# Altium footprint library Connectors.PcbLib: 68 footprints (part 4 of 5)
Each footprint in its own frame and in the unit in brackets; x right, y up, seen from the top. Pads: shape width x height; smd on the part's side, far side on the other; paste and mask are expansions set on the pad; w line width, h text height; cw(c..) or ccw(c..) is an arc to the next point about the centre after c.
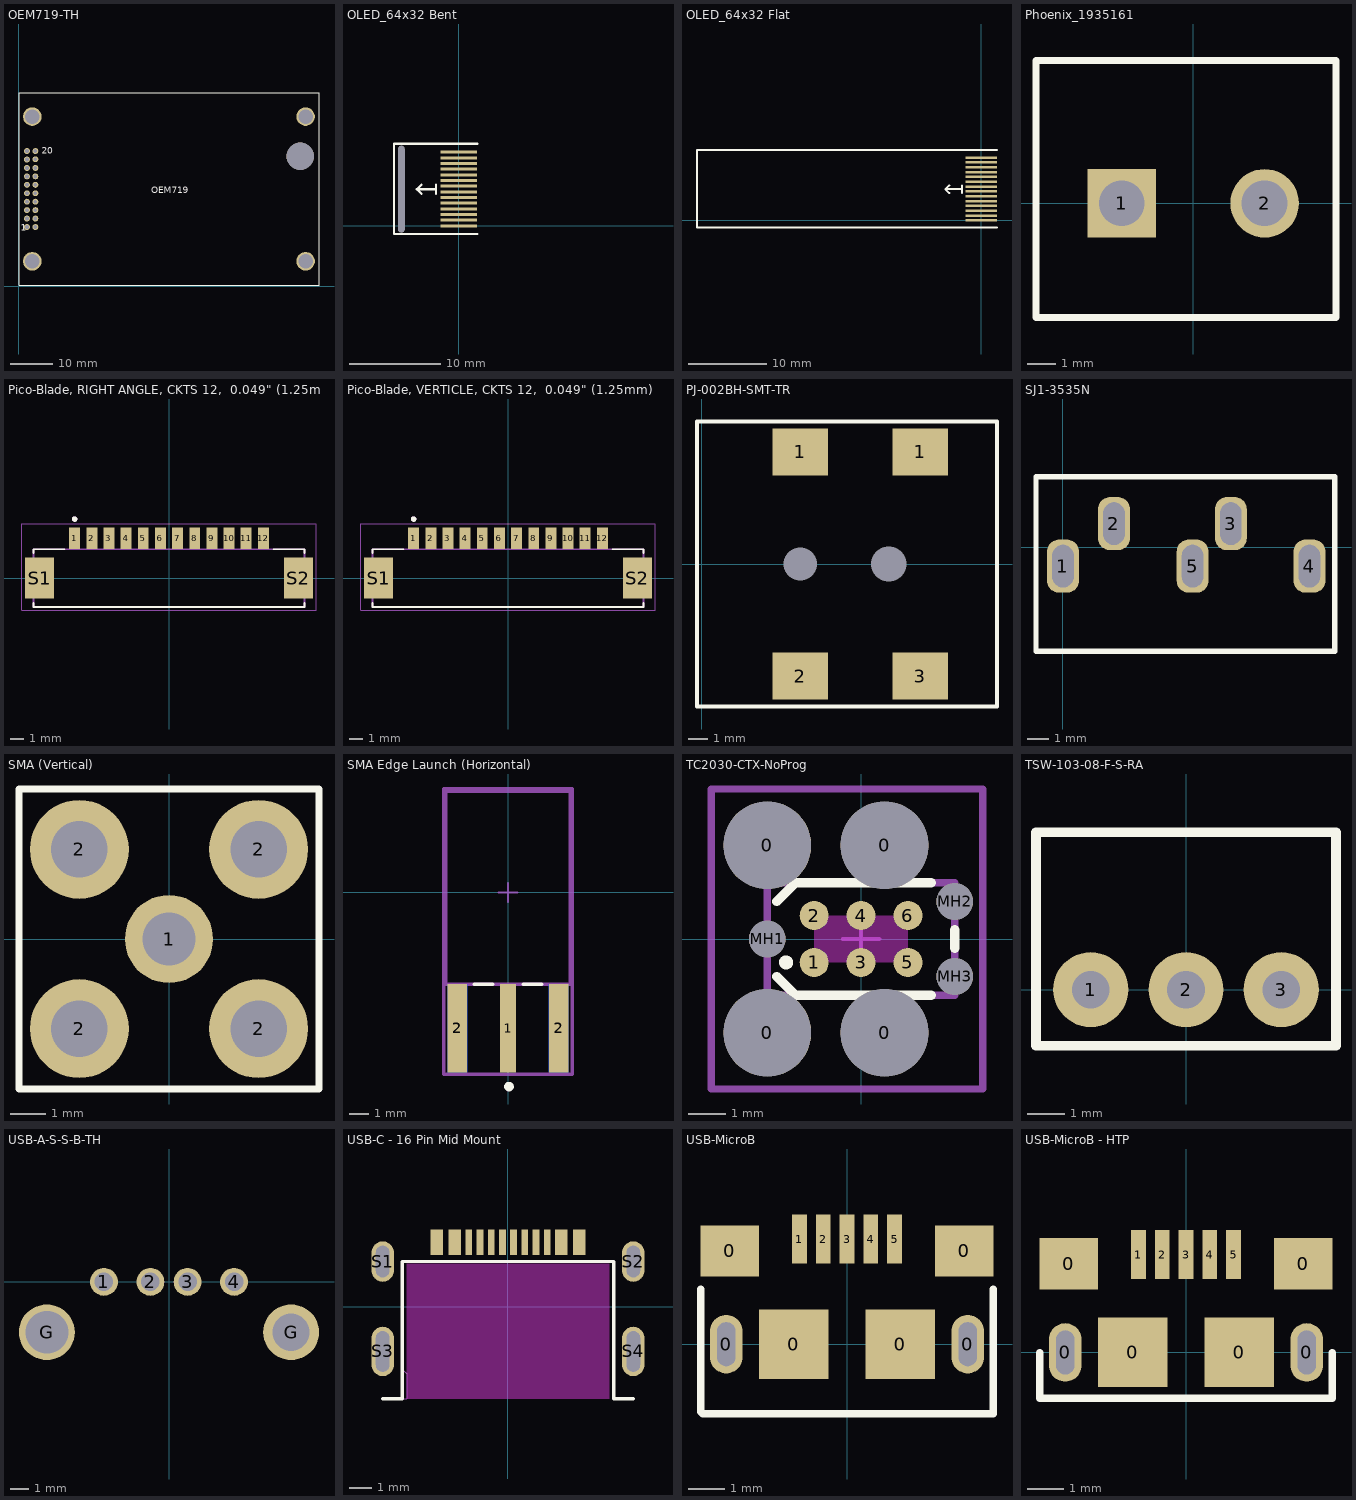
[diagram p3: the footprints below, top view; thin cyan lines are the x and y axes]

## OEM719-TH [mm] "OEM719 GPS through hole footprint"
height 6.5
pads (25):
  round 1.4 hole 0.89: 1(1.98,13.99) 2(3.98,13.99) 3(1.98,15.99) 4(3.98,15.99) 5(1.98,17.99) 6(3.98,17.99) 7(1.98,19.99) 8(3.98,19.99) 9(1.98,21.99) 10(3.98,21.99) 11(1.98,23.99) 12(3.98,23.99) 13(1.98,25.99) 14(3.98,25.99) 15(1.98,27.99) 16(3.98,27.99) 17(1.98,29.99) 18(3.98,30.04) 19(1.98,31.99) 20(3.98,31.99)
  round 4.4 hole 3.45: ""(3.25,5.87) ""(3.25,40.16) ""(68.02,5.87) ""(68.02,40.16)
  round 6.5 hole 6.5: ""(66.75,30.76)
Top Overlay:
  lines w0.254: 0.1,0.15 71.2,0.15 71.2,45.85 0.1,45.85 0.1,0.15
  text "20" at 5.45,31.4 h1.52
  text "1" at 0.55,13.15 h1.52
  text "OEM719" at 31.45,21.95 h1.52

## OLED_64x32 Bent [mm] "0.69\" OLED Bent"
pads (15):
  rect 4x0.32 smd: 1(0,0) 2(0,0.62) 3(0,1.24) 4(0,1.86) 5(0,2.48) 6(0,3.1) 7(0,3.72) 8(0,4.34) 9(0,4.96) 10(0,5.58) 11(0,6.2) 12(0,6.82) 13(0,7.44) 14(0,8.06)
  rrect50% 0x0 hole 9.5 slot 0.7 at 0 deg unplated: 7(-6.3,4.015)
Top Overlay:
  lines w0.254: -4.1,3.5 -4.6,4 ; -4.1,4.5 -4.6,4 ; -2.5,3.5 -2.5,4.5 ; -2.5,4 -4.6,4 ; 2,-0.9 -7.1,-0.9 -7.1,9 2,9 ; -4.6,4 -4.6,4
Bottom Overlay:
  lines w0.254: -7.1,-0.9 -7.1,9 21.8,9 21.8,-0.9 -7.1,-0.9
3D body "0.69_ OLED Bent v15.step": height 1.51, standoff -1.09, extent -6.47,-0.47 21.47,8.53

## OLED_64x32 Flat [mm] "0.69\" OLED Flat"
pads (14):
  rect 4x0.32 smd: 1(0,0) 2(0,0.62) 3(0,1.24) 4(0,1.86) 5(0,2.48) 6(0,3.1) 7(0,3.72) 8(0,4.34) 9(0,4.96) 10(0,5.58) 11(0,6.2) 12(0,6.82) 13(0,7.44) 14(0,8.06)
Top Overlay:
  lines w0.254: -4.1,3.5 -4.6,4 ; -4.1,4.5 -4.6,4 ; -2.5,3.5 -2.5,4.5 ; -2.5,4 -4.6,4 ; 2,-0.9 -36.4,-0.9 -36.4,9 2,9 ; -4.6,4 -4.6,4
3D body "0.69_ OLED Flat v1.step": height 1.51, standoff 0.01, extent -35.5,-0.47 1.3,8.53

## Phoenix_1935161 [mm] "Phoenix Contact 1935161 2-pos terminal block"
pads (2):
  rect 2.4x2.4 hole 1.6: 1(-2.5,0)
  round 2.4 hole 1.6: 2(2.5,0)
Top Overlay:
  lines w0.254: -5.5,-4 -5.5,5 5,5 5,-4 -5.5,-4
3D body "1935161_03.stp": height 11.41, standoff -3.49, extent -5.485,-4 5.085,5

## Pico-Blade, RIGHT ANGLE, CKTS 12,  0.049" (1.25mm) [mm] "Pico Blade, Right Angle 12 position 0.049\" (1.25mm)"
height 3.5
pads (14):
  rect 0.8x1.6 smd: 1(-6.875,2.9) 2(-5.625,2.9) 3(-4.375,2.9) 4(-3.125,2.9) 5(-1.875,2.9) 6(-0.625,2.9) 7(0.625,2.9) 8(1.875,2.9) 9(3.125,2.9) 10(4.375,2.9) 11(5.625,2.9) 12(6.875,2.9)
  rect 2.1x3 smd: S1(-9.425,0) S2(9.425,0)
Top Overlay:
  circle w0.2: c-6.875,4.3 r0.1
  lines w0.127: -9.875,-1.82 -9.875,-2.1 9.875,-2.1 9.875,-1.82 ; -9.875,1.82 -9.875,2.1 -7.6,2.1 ; 7.6,2.1 9.875,2.1 9.875,1.82
3D Bodies:
  circle w0.2: c-6.875,4.3 r0.1
  circle w0.2: c-6.875,4.3 r0.1
  lines w0.127: -9.875,-2.1 -9.875,2.1 ; -9.875,-2.1 9.875,-2.1 ; -9.875,-2.1 -9.875,2.1 ; -9.875,-2.1 9.875,-2.1 ; -9.875,2.1 9.875,2.1 ; -9.875,2.1 9.875,2.1 ; 9.875,-2.1 9.875,2.1 ; 9.875,-2.1 9.875,2.1
Component Info:
  lines w0.05: -10.72,-2.35 -10.72,3.95 10.72,3.95 10.72,-2.35 -10.72,-2.35
3D body "532617012.stp": height 3.4, standoff 0, extent -10.075,-1.737 10.075,3.463

## Pico-Blade, VERTICLE, CKTS 12,  0.049" (1.25mm) [mm] "Pico Blade, Verticle 12 position 0.049\" (1.25mm)"
height 3.5
pads (14):
  rect 0.8x1.6 smd: 1(-6.875,2.9) 2(-5.625,2.9) 3(-4.375,2.9) 4(-3.125,2.9) 5(-1.875,2.9) 6(-0.625,2.9) 7(0.625,2.9) 8(1.875,2.9) 9(3.125,2.9) 10(4.375,2.9) 11(5.625,2.9) 12(6.875,2.9)
  rect 2.1x3 smd: S1(-9.425,0) S2(9.425,0)
Top Overlay:
  circle w0.2: c-6.875,4.3 r0.1
  lines w0.127: -9.875,-1.82 -9.875,-2.1 9.875,-2.1 9.875,-1.82 ; -9.875,1.82 -9.875,2.1 -7.6,2.1 ; 7.6,2.1 9.875,2.1 9.875,1.82
3D Bodies:
  circle w0.2: c-6.875,4.3 r0.1
  circle w0.2: c-6.875,4.3 r0.1
  lines w0.127: -9.875,-2.1 -9.875,2.1 ; -9.875,-2.1 9.875,-2.1 ; -9.875,-2.1 -9.875,2.1 ; -9.875,-2.1 9.875,-2.1 ; -9.875,2.1 9.875,2.1 ; -9.875,2.1 9.875,2.1 ; 9.875,-2.1 9.875,2.1 ; 9.875,-2.1 9.875,2.1
Component Info:
  lines w0.05: -10.72,-2.35 -10.72,3.95 10.72,3.95 10.72,-2.35 -10.72,-2.35
3D body "533981271.stp": height 4.71, standoff -0.04, extent -10.075,-1.4 10.075,2.8

## PJ-002BH-SMT-TR [mm] "CONN PWR JACK 2.5X5.5MM SOLDER"
height 11
pads (6):
  rect 2.8x2.4 smd: 1(5,5.7) 1(11.1,5.7) 2(5,-5.7) 3(11.1,-5.7)
  round 0 hole 1.7 unplated: G(5,0)
  round 0 hole 1.8 unplated: G(9.5,0)
Top Overlay:
  lines w0.2: -0.25,-7.25 -0.25,7.25 15,7.25 15,-7.25 -0.25,-7.25
3D body "CUI_PJ-002BH-SMT-TR.step": height 11.2, standoff -1, extent 0,-6.3 14.8,6.3

## SJ1-3535N [mm] "Stereo TRS Switched THT"
pads (5):
  rrect75% 1.5x2.5 hole 1 slot 2 at 90 deg: 1(0,-0.9) 2(2.4,1.1) 3(7.9,1.1) 4(11.6,-0.9) 5(6.1,-0.9)
Top Overlay:
  lines w0.254: -1.27,-4.9 12.8,-4.9 12.8,3.302 -1.27,3.302 -1.27,-4.9
3D body "CUI_DEVICES_SJ1-3535N v2.step": height 12.31, standoff -3.29, extent -5.2,-4.9 12.8,3.3

## SMA (Vertical) [mm]
pads (5):
  round 2.5 hole 1.5: 1(0,0)
  round 2.8 hole 1.6: 2(-2.54,-2.54) 2(-2.54,2.54) 2(2.54,-2.54) 2(2.54,2.54)
Top Overlay:
  lines w0.2: -4.25,-4.25 -4.25,4.25 4,4.25 4.25,4.25 4.25,-4.25 -4.25,-4.25
3D body "Molex - 73391-0060.STEP": height 9.01, standoff -3.54, extent -3.04,-3.04 3.04,3.04

## SMA Edge Launch (Horizontal) [mm]
pads (5):
  rect 0.85x4.56 smd paste+0 mask+0: 1(0,-7.03)
  rect 1x4.56 smd paste+0 mask+0: 2(-2.62,-7.03) 2(2.62,-7.03)
  rect 1x4.56 smd far side paste+0 mask+0: 2(-2.62,-7.03) 2(2.62,-7.03)
Top Overlay:
  circle w0.25: c0.05,-10.045 r0.125
  lines w0.2: -1.745,-4.75 -0.8,-4.75 ; 0.8,-4.75 1.745,-4.75
Top Dimensions and Assy Info:
  lines w0.2: -3.325,-9.41 -3.325,5.35 3.325,5.35 3.325,-9.41 -3.325,-9.41
  text ".Designator" at 0,-2.031 h1
3D Bodies:
  lines w0.2: -3.225,-4.75 -3.225,5.25 3.225,5.25 3.225,-4.75 -3.225,-4.75
Component Info:
  lines w0.2: -3.325,-9.41 -3.325,5.35 3.325,5.35 3.325,-9.41 -3.325,-9.41
Mechanical 16:
  lines w0.1: -0.5,0 0.5,0 ; 0,-0.5 0,0.5
3D body "Conn_Taoglas_Limited_EMPCB_SMAFSTJ_B_HT_eec.STEP": height 3.58, standoff -2.8, extent -3.191,-8.25 3.191,5.05

## TC2030-CTX-NoProg [mil] "Default Settings Test"
pads (13):
  round 93.5 hole 93.5 unplated mask+0: 0(-100,-100) 0(-100,100) 0(25,-100) 0(25,100)
  round 30.98 smd paste-100 mask+0: 1(-50,-25) 2(-50,25) 3(0,-25) 4(0,25) 5(50,-25) 6(50,25)
  round 39.02 hole 39.02 unplated paste-99999 mask+0: MH1(-100,0) MH2(100,40) MH3(100,-40)
Top Layer keep-out:
  region: -34.51,-25 -15.49,-25 -15.19,-21.98 -12.88,-16.39 -8.61,-12.12 -3.02,-9.8 3.02,-9.8 8.61,-12.12 12.88,-16.39 15.19,-21.98 15.49,-25 34.51,-25 34.81,-21.98 37.12,-16.39 41.39,-12.12 46.98,-9.8 50,-9.51 50,9.51 46.98,9.81 41.39,12.12 37.12,16.39 34.81,21.98 34.51,25 15.49,25 15.19,21.98 12.88,16.39 8.61,12.12 3.02,9.81 -3.02,9.81 -8.61,12.12 -12.88,16.39 -15.19,21.98 -15.49,25 -34.51,25 -34.8,21.98 -37.12,16.39 -41.39,12.12 -46.98,9.81 -50,9.51 -50,-9.51 -46.98,-9.8 -41.39,-12.12 -37.12,-16.39 -34.8,-21.98
Top Overlay:
  circle w10: c-80,-25 r2.5
  lines w10: -90,-40 -70,-60 21.25,-60 75,-60 ; -90,40 -70,60 21.25,60 75,60 ; 100,-10 100,10
Top Courtyard:
  lines w3.94: -19.68,0 19.69,0 ; 0,-19.68 0,19.69
  lines w7.87: -160,-160 130,-160 130,160 -160,160 -160,-160
Top Assembly:
  lines w7.87: -100,-60 -100,60 100,60 100,-60 -100,-60
  text ".Designator" at -88.59,-8.9 h39.37

## TSW-103-08-F-S-RA [mm] ".025\" SQ. TERMINAL STRIPS"
height 3
pads (3):
  round 2 hole 1: 1(-2.54,0) 2(0,0) 3(2.54,0)
Top Overlay:
  lines w0.254: -4,-1.5 4,-1.5 4,0 4,4.2 -4,4.2 -4,0 -4,-1.5
3D body "TSW-103-08-F-S-RA.stp": height 3.02, standoff -2.29, extent -3.82,-0.312 3.8,9.912

## USB-A-S-S-B-TH [mm] "USB TYPE A BLACK SNGL T/H"
height 7.1
pads (6):
  round 1.5 hole 1: 1(-3.5,0) 2(-1,0) 3(1,0) 4(3.5,0)
  round 3 hole 2.3: G(-6.57,-2.71)
  round 3 hole 2: G(6.57,-2.71)
3D body "USB-A-S-S-B-TH.stp": height 7.47, standoff -4.42, extent -7.874,-13.1 7.875,1

## USB-C - 16 Pin Mid Mount [mm] "16 Pin USB C Mid Mount"
pads (20):
  rect 0.3x1.15 smd: A1(-3.3,2.86) A4(-2.5,2.86) A5(-1.25,2.86) A6(-0.25,2.86) A7(0.25,2.86) A8(1.25,2.86) A9(2.5,2.86) A12(3.3,2.86) B1(3.05,2.86) B4(2.25,2.86) B5(1.75,2.86) B6(0.75,2.86) B7(-0.75,2.86) B8(-1.75,2.86) B9(-2.25,2.86) B12(-3.05,2.86)
  oval 1x1.8 hole 0.6 slot 1.4 at 90 deg: S1(-5.575,2) S2(5.575,2)
  oval 1x2.2 hole 0.6 slot 1.8 at 90 deg: S3(-5.575,-2) S4(5.575,-2)
Top Overlay:
  lines w0.15: -5.575,-4.1 -4.7,-4.1 -4.7,2 4.7,2 4.7,-4.1 5.575,-4.1
Keep-Out Layer:
  region: 4.5,-4.1 -4.5,-4.1 -4.5,1.9 4.5,1.9
Component Info:
  lines w0.05: -5.6,-4.1 -4.5,-4.097 -4.503,-2.997 -4.694,-2.807 -4.703,0.715 -4.706,1.975 -3.446,1.979 4.694,2.001 4.71,-4.102 5.6,-4.1
3D body "USB C Mid Mount 16 pin v7.step": height 1.82, standoff -1.34, extent -5.725,-4.8 5.725,3.1

## USB-MicroB [mm] "CONN RCPT USB TYPE B 3A"
height 2.6
pads (11):
  oval 0.9x1.6 hole 0.5 slot 1.2 at 90 deg: 0(-3.3,0) 0(3.3,0)
  rect 1.6x1.4 smd: 0(-3.2,2.55) 0(3.2,2.55)
  rect 1.9x1.9 smd: 0(-1.45,0) 0(1.45,0)
  rect 0.4x1.35 smd: 1(-1.3,2.875) 2(-0.65,2.875) 3(0,2.875) 4(0.65,2.875) 5(1.3,2.875)
Top Overlay:
  lines w0.2: -4,1.5 -4,-1.85 -3.95,-1.9 4,-1.9 4,1.5
3D body "10118193-0001lfc.stp": height 2.88, standoff -0.72, extent -3.929,-2.761 3.928,2.9

## USB-MicroB - HTP [mm] "CONN RCPT USB TYPE B 3A"
height 2.6
pads (11):
  oval 0.9x1.6 hole 0.5 slot 1.2 at 90 deg: 0(-3.3,0) 0(3.3,0)
  rect 1.6x1.4 smd: 0(-3.2,2.425) 0(3.2,2.425)
  rect 1.9x1.9 smd: 0(-1.45,0) 0(1.45,0)
  rect 0.4x1.35 smd mask+0.135: 1(-1.3,2.675) 2(-0.65,2.675) 3(0,2.675) 4(0.65,2.675) 5(1.3,2.675)
Top Overlay:
  lines w0.2: -4,-1.25 -4,0 ; -3.95,-1.25 4,-1.25 4,0
3D body "10118193-0001lfc.stp": height 2.88, standoff -0.72, extent -3.929,-2.761 3.928,2.9